# Altium footprint library Connector.PcbLib: 536 footprints (part 16 of 34)
Each footprint in its own frame and in the unit in brackets; x right, y up, seen from the top. Pads: shape width x height; smd on the part's side, far side on the other; paste and mask are expansions set on the pad; w line width, h text height; cw(c..) or ccw(c..) is an arc to the next point about the centre after c.
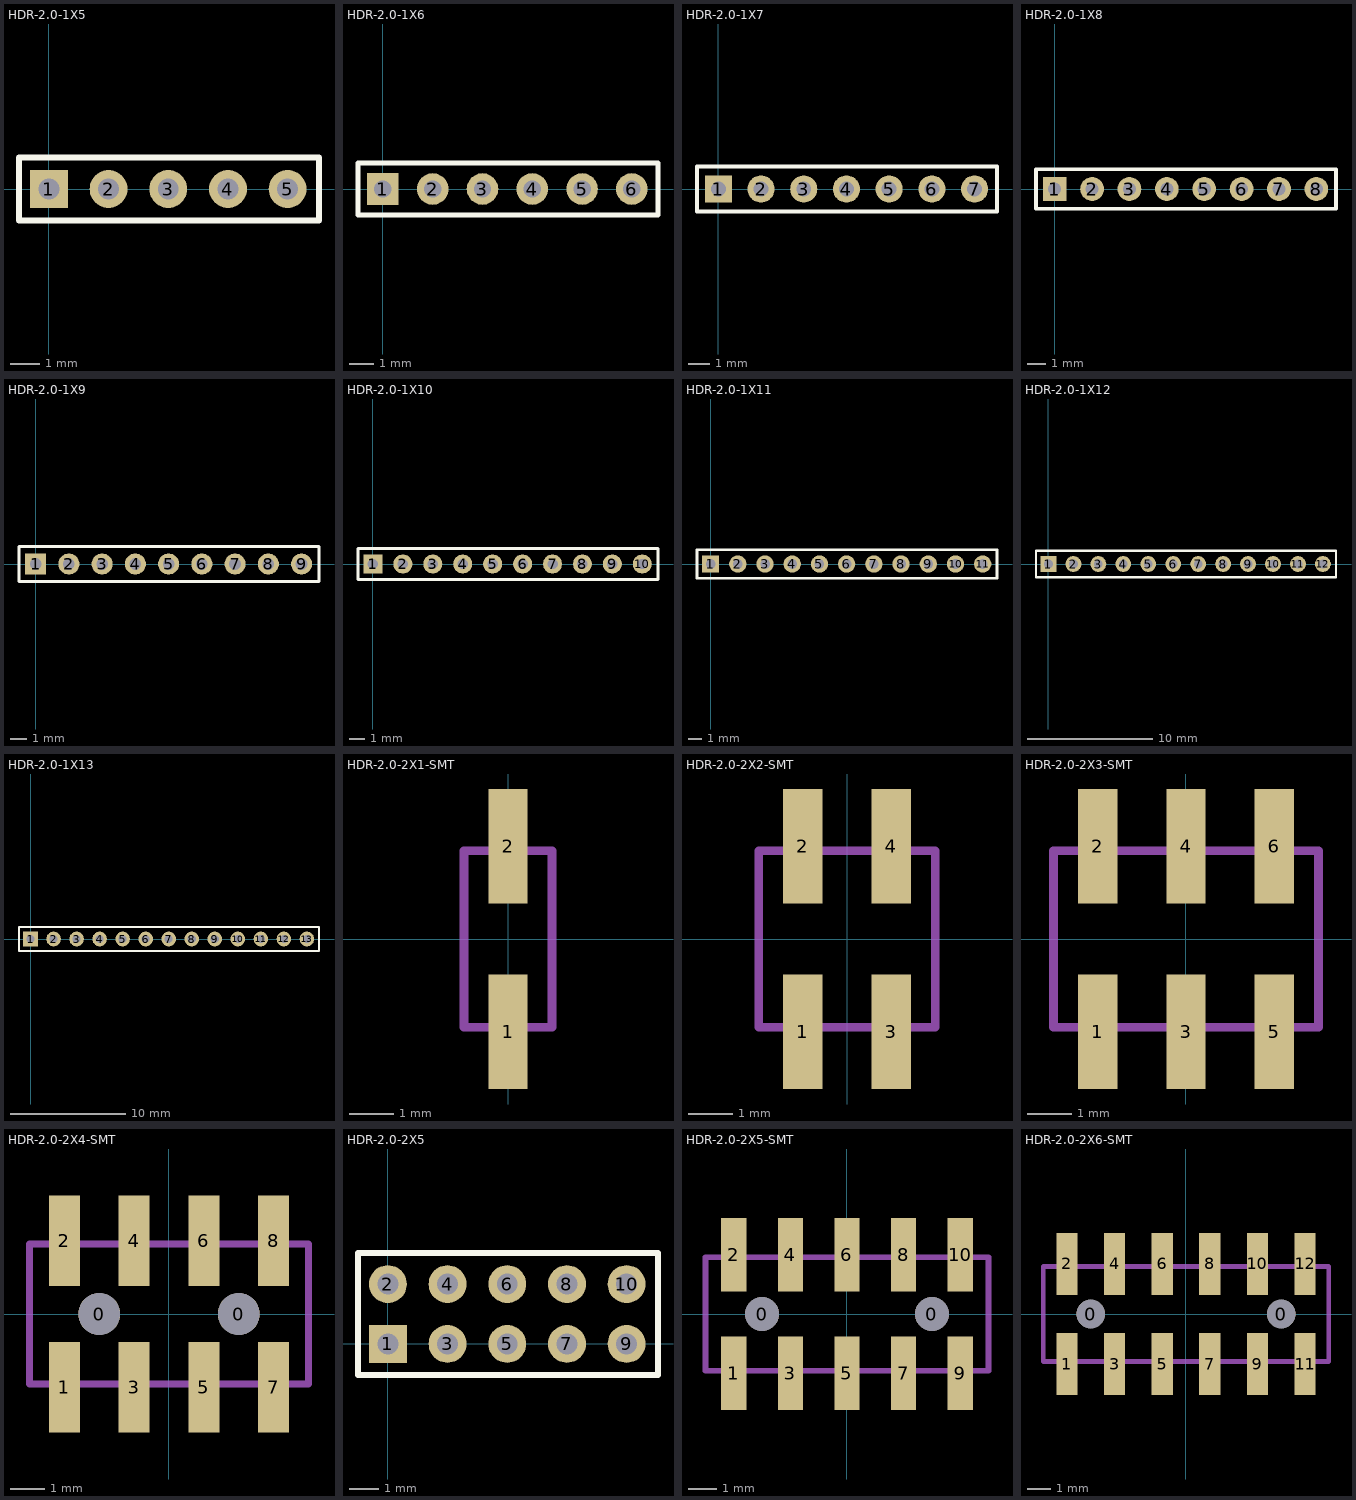
[diagram p15: the footprints below, top view; thin cyan lines are the x and y axes]

## HDR-2.0-1X5 [mm]
pads (5):
  rect 1.27x1.27 hole 0.7: 1(0,0)
  round 1.27 hole 0.7: 2(2,0) 3(4,0) 4(6,0) 5(8,0)
Top Overlay:
  lines w0.2: -1,-1.05 9.05,-1.05 9.05,1.05 -1,1.05 -1,-1.05

## HDR-2.0-1X6 [mm]
pads (6):
  rect 1.27x1.27 hole 0.7: 1(0,0)
  round 1.27 hole 0.7: 2(2,0) 3(4,0) 4(6,0) 5(8,0) 6(10,0)
Top Overlay:
  lines w0.2: -1,-1.05 -1,1.05 11.05,1.05 11.05,-1.05 -1,-1.05

## HDR-2.0-1X7 [mm]
pads (7):
  rect 1.27x1.27 hole 0.7: 1(0,0)
  round 1.27 hole 0.7: 2(2,0) 3(4,0) 4(6,0) 5(8,0) 6(10,0) 7(12,0)
Top Overlay:
  lines w0.2: -1,-1.05 -1,1.05 13.05,1.05 13.05,-1.05 -1,-1.05

## HDR-2.0-1X8 [mm]
pads (8):
  rect 1.27x1.27 hole 0.7: 1(0,0)
  round 1.27 hole 0.7: 2(2,0) 3(4,0) 4(6,0) 5(8,0) 6(10,0) 7(12,0) 8(14,0)
Top Overlay:
  lines w0.2: -1,-1.05 15.05,-1.05 15.05,1.05 -1,1.05 -1,-1.05

## HDR-2.0-1X9 [mm]
pads (9):
  rect 1.27x1.27 hole 0.7: 1(0,0)
  round 1.27 hole 0.7: 2(2,0) 3(4,0) 4(6,0) 5(8,0) 6(10,0) 7(12,0) 8(14,0) 9(16,0)
Top Overlay:
  lines w0.2: -1,-1.05 17.05,-1.05 17.05,1.05 -1,1.05 -1,-1.05

## HDR-2.0-1X10 [mm]
pads (10):
  rect 1.27x1.27 hole 0.7: 1(0,0)
  round 1.27 hole 0.7: 2(2,0) 3(4,0) 4(6,0) 5(8,0) 6(10,0) 7(12,0) 8(14,0) 9(16,0) 10(18,0)
Top Overlay:
  lines w0.2: -1,-1.05 19.05,-1.05 19.05,1.05 -1,1.05 -1,-1.05

## HDR-2.0-1X11 [mm]
pads (11):
  rect 1.27x1.27 hole 0.7: 1(0,0)
  round 1.27 hole 0.7: 2(2,0) 3(4,0) 4(6,0) 5(8,0) 6(10,0) 7(12,0) 8(14,0) 9(16,0) 10(18,0) 11(20,0)
Top Overlay:
  lines w0.2: -1,-1.05 21.05,-1.05 21.05,1.05 -1,1.05 -1,-1.05

## HDR-2.0-1X12 [mm]
pads (12):
  rect 1.27x1.27 hole 0.7: 1(0,0)
  round 1.27 hole 0.7: 2(2,0) 3(4,0) 4(6,0) 5(8,0) 6(10,0) 7(12,0) 8(14,0) 9(16,0) 10(18,0) 11(20,0) 12(22,0)
Top Overlay:
  lines w0.2: -1,-1.05 23.05,-1.05 23.05,1.05 -1,1.05 -1,-1.05

## HDR-2.0-1X13 [mm]
pads (13):
  rect 1.27x1.27 hole 0.7: 1(0,0)
  round 1.27 hole 0.7: 2(2,0) 3(4,0) 4(6,0) 5(8,0) 6(10,0) 7(12,0) 8(14,0) 9(16,0) 10(18,0) 11(20,0) 12(22,0) 13(24,0)
Top Overlay:
  lines w0.2: -1,-1.05 25.05,-1.05 25.05,1.05 -1,1.05 -1,-1.05

## HDR-2.0-2X1-SMT [mm]
pads (2):
  rect 0.89x2.6 smd: 1(0,-2.1) 2(0,2.1)
Mechanical 15:
  lines w0.2: 0.991,-2 -1,-2 -1,2 0.991,2 ; 1,-2 1,2
3D body "2.0-2x1 SMT.STEP": height 6.7, standoff 0, extent -1,-3.25 1,3.25

## HDR-2.0-2X2-SMT [mm]
pads (4):
  rect 0.89x2.6 smd: 1(-1,-2.1) 2(-1,2.1) 3(1,-2.1) 4(1,2.1)
Mechanical 15:
  lines w0.2: -2,-2 -2,2 2,2 2,-2 -2,-2
3D body "2.0-2x2 SMT.stp": height 6.5, standoff 0, extent -2,-3.25 1.95,3.25

## HDR-2.0-2X3-SMT [mm]
pads (6):
  rect 0.89x2.6 smd: 1(-2,-2.1) 2(-2,2.1) 3(0,-2.1) 4(0,2.1) 5(2,-2.1) 6(2,2.1)
Mechanical 15:
  lines w0.2: -3,-2 -3,2 3,2 3,-2 -3,-2
3D body "2.0-2x3 SMT.STEP": height 6.7, standoff 0, extent -3,-3.25 3,3.25

## HDR-2.0-2X4-SMT [mm]
pads (10):
  round 1.2 hole 1.2: 0(-2,0) 0(2,0)
  rect 0.89x2.6 smd: 1(-3,-2.1) 2(-3,2.1) 3(-1,-2.1) 4(-1,2.1) 5(1,-2.1) 6(1,2.1) 7(3,-2.1) 8(3,2.1)
Mechanical 15:
  lines w0.2: -4,-2 -4,2 4,2 4,-2 -4,-2
3D body "2.0-2x4 SMT.STEP": height 6.7, standoff 0, extent -4,-3.25 4,3.25

## HDR-2.0-2X5 [mm]
pads (10):
  rect 1.27x1.27 hole 0.7: 1(0,0)
  round 1.27 hole 0.7: 2(0,2) 3(2,0) 4(2,2) 5(4,0) 6(4,2) 7(6,0) 8(6,2) 9(8,0) 10(8,2)
Top Overlay:
  lines w0.2: -1,-1.05 9.05,-1.05 9.05,3.05 -1,3.05 -1,-1.05

## HDR-2.0-2X5-SMT [mm]
pads (12):
  round 1.2 hole 1.2: 0(-3,0) 0(3,0)
  rect 0.89x2.6 smd: 1(-4,-2.1) 2(-4,2.1) 3(-2,-2.1) 4(-2,2.1) 5(0,-2.1) 6(0,2.1) 7(2,-2.1) 8(2,2.1) 9(4,-2.1) 10(4,2.1)
Mechanical 15:
  lines w0.2: -5,-2 5,-2 5,2 -5,2 -5,-2
3D body "2.0-2x5 SMT.STEP": height 6.7, standoff 0, extent -5,-3.25 5,3.25

## HDR-2.0-2X6-SMT [mm]
pads (14):
  round 1.2 hole 1.2: 0(-4,0) 0(4,0)
  rect 0.89x2.6 smd: 1(-5,-2.1) 2(-5,2.1) 3(-3,-2.1) 4(-3,2.1) 5(-1,-2.1) 6(-1,2.1) 7(1,-2.1) 8(1,2.1) 9(3,-2.1) 10(3,2.1) 11(5,-2.1) 12(5,2.1)
Mechanical 15:
  lines w0.2: -6,-2 -6,2 6,2 6,-2 -6,-2
3D body "2.0-2x6 SMT.STEP": height 6.5, standoff 0, extent -6,-3.25 5.95,3.25